# Altium footprint library 3.22-杂项.PcbLib: 985 footprints (part 64 of 64)
Each footprint in its own frame and in the unit in brackets; x right, y up, seen from the top. Pads: shape width x height; smd on the part's side, far side on the other; paste and mask are expansions set on the pad; w line width, h text height; cw(c..) or ccw(c..) is an arc to the next point about the centre after c.
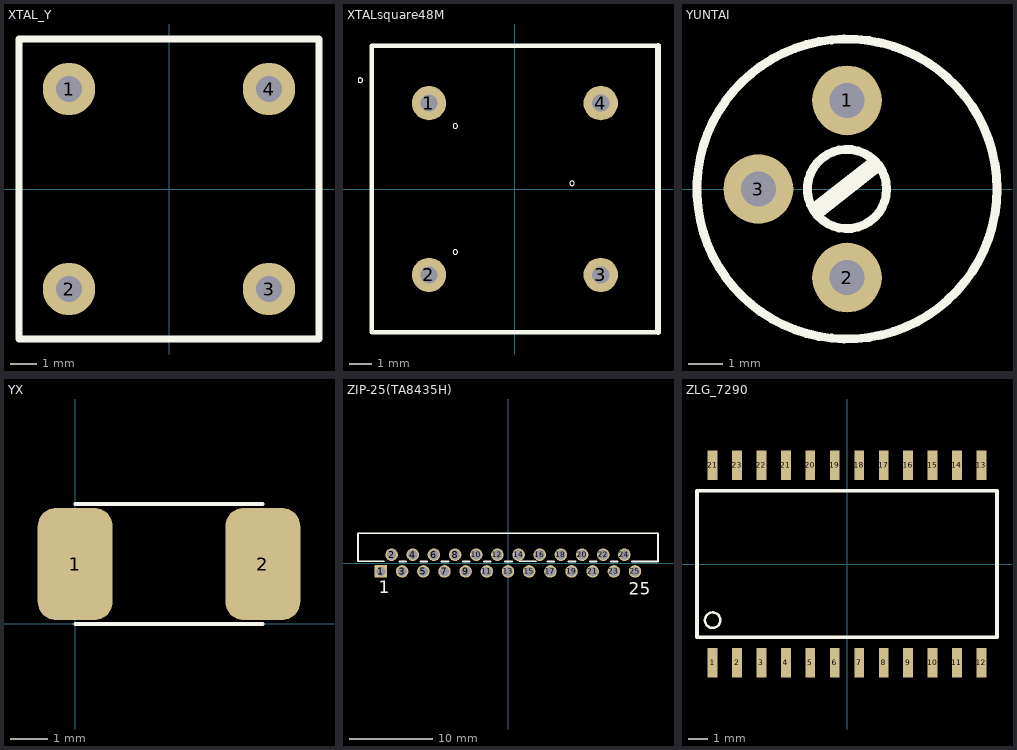
[diagram p63: the footprints below, top view; thin cyan lines are the x and y axes]

## XTAL_Y [mm]
pads (4):
  round 2 hole 1: 1(-3.81,3.81) 2(-3.81,-3.81) 3(3.81,-3.81) 4(3.81,3.81)
Top Overlay:
  lines w0.254: -5.715,-5.715 5.715,-5.715 5.715,5.715 -5.715,5.715 -5.715,-5.715

## XTALsquare48M [mil] "48M方形金属有源晶振"
height 236.22
pads (4):
  round 60 hole 30: 1(-150,150) 2(-150,-150) 3(150,-150) 4(150,150)
Top Overlay:
  circle w1: c-270,190 r4
  circle w1: c-104,110 r4
  circle w1: c-104,-110 r4
  circle w1: c100,10 r4
  lines w8: 250,-250 -250,-250 -250,250 250,250
  lines w10: 250,-250 250,250

## YUNTAI [mm]
pads (3):
  round 2 hole 1: 1(6.35,2.54) 2(6.35,-2.54) 3(3.81,0)
Top Overlay:
  circle w0.254: c6.35,0 r4.3
  circle w0.254: c6.35,0 r1.136
  lines w0.5: 5.54,-0.573 7.099,0.652

## YX [mm]
pads (2):
  rrect50% 2x3 smd: 1(0,1.6) 2(5.004,1.6)
Top Overlay:
  lines w0.1: 0,0 5,0 ; 0,3.2 5,3.2
3D body: height 1.5, standoff 0, extent 0,0 5.004,3.2

## ZIP-25(TA8435H) [mm] "In-Line; 25 Zig-Zag Leads; Body 36x 5.588mm; Pitch 1.27 mm"
height 14.4
pads (25):
  rect 1.5x1.5 hole 1.1: 1(-15.24,-1)
  round 1.5 hole 1.1: 2(-13.97,1) 3(-12.7,-1) 4(-11.43,1) 5(-10.16,-1) 6(-8.89,1) 7(-7.62,-1) 8(-6.35,1) 9(-5.08,-1) 10(-3.81,1) 11(-2.54,-1) 12(-1.27,1) 13(0,-1) 14(1.27,1) 15(2.54,-1) 16(3.81,1) 17(5.08,-1) 18(6.35,1) 19(7.62,-1) 20(8.89,1) 21(10.16,-1) 22(11.43,1) 23(12.7,-1) 24(13.97,1) 25(15.24,-1)
Top Overlay:
  lines w0.2: -14.84,0.2 -18,0.2 -18,3.572 18,3.572 18,0.2 ; 1.36,0.2 3.36,0.2
  lines w0.254: -13.04,0.2 -12.24,0.2 ; -10.5,0.2 -9.7,0.2 ; -7.96,0.2 -7.16,0.2 ; -5.42,0.2 -4.62,0.2 ; -2.88,0.2 -2.08,0.2 ; -0.34,0.2 0.46,0.2 ; 4.74,0.2 5.54,0.2 ; 7.28,0.2 8.08,0.2 ; 9.82,0.2 10.62,0.2 ; 12.36,0.2 13.16,0.2 ; 14.9,0.2 18,0.2
  text "1" at -15.49,-3.625 h1.5
  text "25" at 14.478,-3.794 h1.5

## ZLG_7290 [mil]
height 104
pads (24):
  rect 20x60 smd: 1(-275,-202) 2(-225,-202) 3(-175,-202) 4(-125,-202) 5(-75,-202) 6(-25,-202) 7(25,-202) 8(75,-202) 9(125,-202) 10(175,-202) 11(225,-202) 12(275,-202) 13(275,202) 14(225,202) 15(175,202) 16(125,202) 17(75,202) 18(25,202) 19(-25,202) 20(-75,202) 21(-275,202) 21(-125,202) 22(-175,202) 23(-225,202)
Top Overlay:
  circle w5: c-275,-115 r15.81
  lines w8: -307,-150 307,-150 307,150 -307,150 -307,-150